# Altium footprint library Library_pcb.PcbLib: 59 footprints (part 2 of 4)
Each footprint in its own frame and in the unit in brackets; x right, y up, seen from the top. Pads: shape width x height; smd on the part's side, far side on the other; paste and mask are expansions set on the pad; w line width, h text height; cw(c..) or ccw(c..) is an arc to the next point about the centre after c.
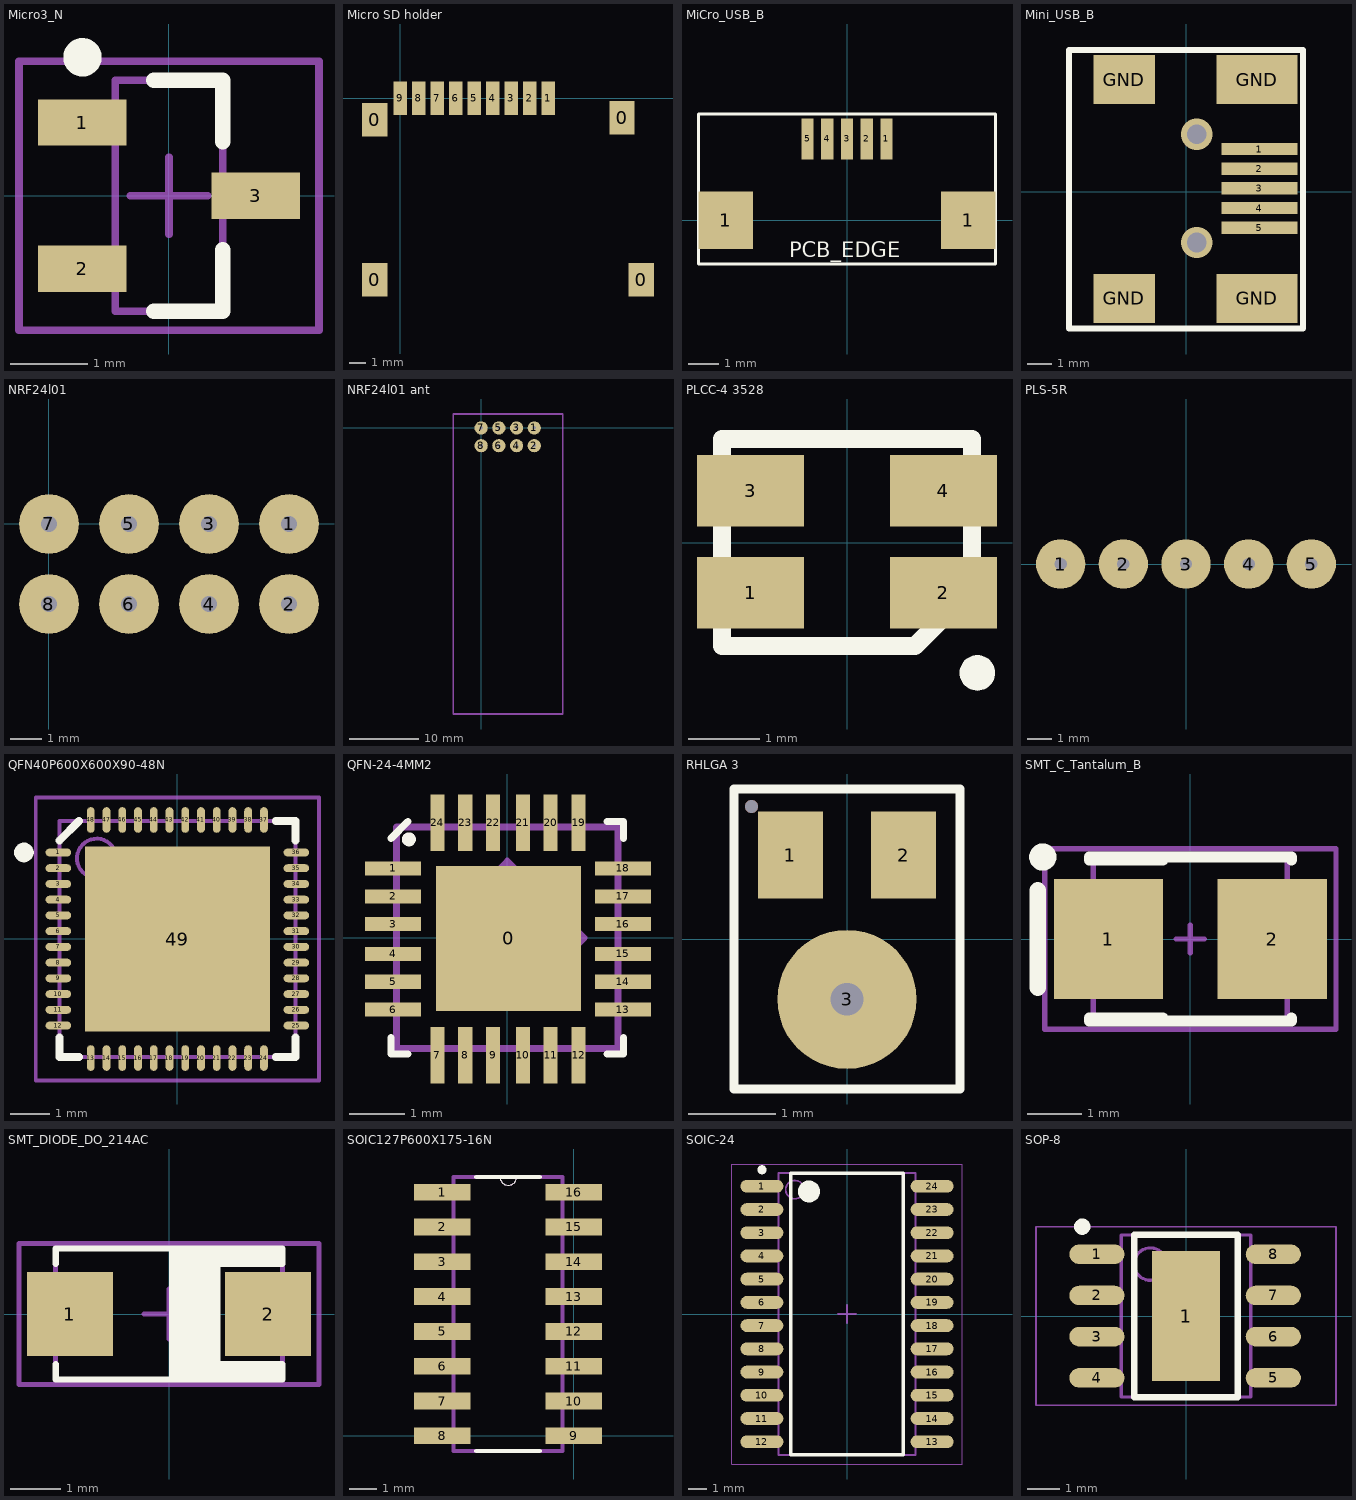
[diagram p1: the footprints below, top view; thin cyan lines are the x and y axes]

## Micro3_N [mm] "SOT23, 3-Leads, Body 2.9x1.3mm, Pitch 0.95mm, Lead Span 2.3mm, IPC Medium Density"
height 1.12
pads (3):
  rect 1.15x0.6 smd: 1(-1.125,0.95) 2(-1.125,-0.95) 3(1.125,0)
Top Overlay:
  circle w0.25: c-1.125,1.8 r0.125
  lines w0.2: -0.2,-1.5 0.7,-1.5 0.7,-0.7 ; -0.2,1.5 0.7,1.5 0.7,0.7
Mechanical 13:
  lines w0.1: -0.7,-1.5 0.7,-1.5 0.7,1.5 -0.7,1.5 -0.7,-1.5
Mechanical 15:
  lines w0.1: -0.5,0 0.5,0 ; 0,-0.5 0,0.5 ; -1.95,-1.75 1.95,-1.75 1.95,1.75 -1.95,1.75 -1.95,-1.75
3D body: height 1.12, standoff 0, extent -0.7,-1.5 0.7,1.5

## Micro SD holder [mm]
pads (13):
  rect 1.5x2 smd: 0(-1.524,-10.795) 0(-1.524,-1.27) 0(13.208,-1.143) 0(14.351,-10.795)
  rect 0.8x2 smd: 1(8.8,0) 2(7.7,0) 3(6.6,0) 4(5.5,0) 5(4.4,0) 6(3.3,0) 7(2.2,0) 8(1.1,0) 9(0,0)
3D body "User Library-Micro SD.step": height 1.91, standoff -0.56, extent -1.651,-15.032 14.656,0.178

## MiCro_USB_B [mm]
pads (7):
  rect 1.8x1.9 smd: 1(-4,0) 1(4,0)
  rect 0.4x1.35 smd: 1(1.3,2.675) 2(0.65,2.675) 3(0,2.675) 4(-0.65,2.675) 5(-1.3,2.675)
Top Overlay:
  lines w0.1: -4.9,-1.45 4.9,-1.45 4.9,3.5 -4.9,3.5 -4.9,-1.45
  text "PCB_EDGE" at -1.9,-1.225 h0.5

## Mini_USB_B [mm]
pads (9):
  rect 3.1x0.5 smd: 1(2.987,1.738) 2(2.987,0.938) 3(2.987,0.138) 4(2.987,-0.663) 5(2.987,-1.463)
  rect 2.5x2 smd: GND(-2.512,-4.337) GND(-2.512,4.563)
  rect 3.3x2 smd: GND(2.887,-4.337) GND(2.887,4.563)
via 0.437,2.338 diameter 1.27 hole 0.8
via 0.437,-2.062 diameter 1.27 hole 0.8
Top Overlay:
  lines w0.254: -4.763,-5.562 4.763,-5.562 4.763,5.762 -4.763,5.762 -4.763,5.563 -4.763,-5.562

## NRF24l01 [mm]
pads (8):
  round 1.9 hole 0.5: 1(7.62,0) 2(7.62,-2.54) 3(5.08,0) 4(5.08,-2.54) 5(2.54,0) 6(2.54,-2.54) 7(0,0) 8(0,-2.54)
3D body "nRF24L01+_enhanced.STEP": height 6.86, standoff -5.99, extent -5.341,-27.552 9.659,1.448

## NRF24l01 ant [mm]
pads (8):
  round 1.9 hole 0.5: 1(7.62,0) 2(7.62,-2.54) 3(5.08,0) 4(5.08,-2.54) 5(2.54,0) 6(2.54,-2.54) 7(0,0) 8(0,-2.54)
Mechanical 1:
  lines w0.1: -0.2,-2.74 -0.2,-2.34 0.2,-2.34 0.2,-2.74 -0.2,-2.74 ; -0.2,-0.2 0.2,-0.2 0.2,0.2 -0.2,0.2 -0.2,-0.2 ; 2.34,-2.74 2.34,-2.34 2.74,-2.34 2.74,-2.74 2.34,-2.74 ; 2.34,-0.2 2.34,0.2 2.74,0.2 2.74,-0.2 2.34,-0.2 ; 4.88,-2.74 4.88,-2.34 5.28,-2.34 5.28,-2.74 4.88,-2.74 ; 4.88,-0.2 4.88,0.2 5.28,0.2 5.28,-0.2 4.88,-0.2 ; 7.42,-2.74 7.42,-2.34 7.82,-2.34 7.82,-2.74 7.42,-2.74 ; 7.42,-0.2 7.42,0.2 7.82,0.2 7.82,-0.2 7.42,-0.2
  lines w0.254: -4,-41 11.7,-41 11.7,-25.3 11.7,0 11.7,2 -4,2 -4,-41
3D body: height 2, standoff 0, extent -4.127,-41.127 11.827,2.127
3D body: height 2.5, standoff -3, extent -0.199,-2.739 0.199,-2.341
3D body: height 2.5, standoff -3, extent 2.341,-2.739 2.739,-2.341
3D body: height 2.5, standoff -3, extent -0.199,-0.199 0.199,0.199
3D body: height 2.5, standoff -3, extent 2.341,-0.199 2.739,0.199
3D body: height 2.5, standoff -3, extent 4.881,-2.739 5.279,-2.341
3D body: height 2.5, standoff -3, extent 7.421,-2.739 7.819,-2.341
3D body: height 2.5, standoff -3, extent 4.881,-0.199 5.279,0.199
3D body: height 2.5, standoff -3, extent 7.421,-0.199 7.819,0.199

## PLCC-4 3528 [mm]
pads (5):
  rect 1.5x1 smd: 1(-1.35,-0.7) 2(1.35,-0.7) 3(-1.35,0.725) 4(1.35,0.725)
  round 0.5 on Top Overlay: ""(1.825,-1.825)
Top Overlay:
  lines w0.254: -1.75,-1.45 0.95,-1.45 1.75,-0.65 1.75,1.45 -1.75,1.45 -1.75,-1.45

## PLS-5R [mm]
pads (5):
  round 2 hole 0.5: 1(-5.08,0) 2(-2.54,0) 3(0,0) 4(2.54,0) 5(5.08,0)
3D body "User Library-PLS-5R.step": height 2.55, standoff -2.53, extent -6.35,-0.254 6.35,9.195

## QFN40P600X600X90-48N [mm]
pads (49):
  oval 0.65x0.2 smd: 1(-3.025,2.2) 2(-3.025,1.8) 3(-3.025,1.4) 4(-3.025,1) 5(-3.025,0.6) 6(-3.025,0.2) 7(-3.025,-0.2) 8(-3.025,-0.6) 9(-3.025,-1) 10(-3.025,-1.4) 11(-3.025,-1.8) 12(-3.025,-2.2) 25(3.025,-2.2) 26(3.025,-1.8) 27(3.025,-1.4) 28(3.025,-1) 29(3.025,-0.6) 30(3.025,-0.2) 31(3.025,0.2) 32(3.025,0.6) 33(3.025,1) 34(3.025,1.4) 35(3.025,1.8) 36(3.025,2.2)
  oval 0.2x0.65 smd: 13(-2.2,-3.025) 14(-1.8,-3.025) 15(-1.4,-3.025) 16(-1,-3.025) 17(-0.6,-3.025) 18(-0.2,-3.025) 19(0.2,-3.025) 20(0.6,-3.025) 21(1,-3.025) 22(1.4,-3.025) 23(1.8,-3.025) 24(2.2,-3.025) 37(2.2,3.025) 38(1.8,3.025) 39(1.4,3.025) 40(1,3.025) 41(0.6,3.025) 42(0.2,3.025) 43(-0.2,3.025) 44(-0.6,3.025) 45(-1,3.025) 46(-1.4,3.025) 47(-1.8,3.025) 48(-2.2,3.025)
  rect 4.7x4.7 smd: 49(0,0)
Top Overlay:
  circle w0.25: c-3.9,2.2 r0.125
  lines w0.2: -3,-2.5 -3,-3 -2.5,-3 ; -3,2.5 -2.5,3 ; 2.5,-3 3,-3 3,-2.5 ; 2.5,3 3,3 3,2.5
Mechanical 13:
  circle w0.1: c-2.05,2.05 r0.5
  lines w0.1: -3,-3 -3,3 3,3 3,-3 -3,-3
Mechanical 15:
  lines w0.1: -0.5,0 0.5,0 ; 0,-0.5 0,0.5 ; -3.6,-3.6 -3.6,3.6 3.6,3.6 3.6,-3.6 -3.6,-3.6
3D body: height 0.9, standoff 0, extent -3,-3 3,3

## QFN-24-4MM2 [mil]
pads (25):
  rect 103x103 smd mask-1000: 0(0.79,-0.39)
  rect 40x10 smd paste-1000 mask-1000: 1(-81.35,49.48) 2(-81.35,29.51) 3(-81.35,9.74) 4(-81.35,-11.32) 5(-81.35,-31.18) 6(-81.35,-51.05) 13(82.13,-51.05) 14(82.13,-31.18) 15(82.13,-11.32) 16(82.13,9.74) 17(82.13,29.51) 18(82.13,49.48)
  rect 10x40 smd paste-1000 mask-1000: 7(-49.87,-83.53) 8(-30,-83.53) 9(-10.14,-83.53) 10(10.93,-83.53) 11(30.69,-83.53) 12(50.66,-83.53) 19(50.66,81.95) 20(30.69,81.95) 21(10.93,81.95) 22(-10.14,81.95) 23(-30,81.95) 24(-49.87,81.95)
Top Overlay:
  circle w5: c-70.08,70.08 r2.49
  lines w5: -82.68,-70.87 -82.68,-82.68 -70.87,-82.68 ; -82.68,70.87 -70.87,82.68 ; 70.87,-82.68 82.68,-82.68 82.68,-70.87 ; 70.87,82.68 82.68,82.68 82.68,70.87
Top Paste:
  region: -44.87,61.95 -44.87,101.95 -54.87,101.95 -54.87,61.95
  region: -25,61.95 -25,101.95 -35,101.95 -35,61.95
  region: -5.14,61.95 -5.14,101.95 -15.14,101.95 -15.14,61.95
  region: 15.93,61.95 15.93,101.95 5.93,101.95 5.93,61.95
  region: 35.69,61.95 35.69,101.95 25.69,101.95 25.69,61.95
  region: 55.66,61.95 55.66,101.95 45.66,101.95 45.66,61.95
  region: -44.87,-103.53 -44.87,-63.53 -54.87,-63.53 -54.87,-103.53
  region: -25,-103.53 -25,-63.53 -35,-63.53 -35,-103.53
  region: -5.14,-103.53 -5.14,-63.53 -15.14,-63.53 -15.14,-103.53
  region: 15.93,-103.53 15.93,-63.53 5.93,-63.53 5.93,-103.53
  region: 35.69,-103.53 35.69,-63.53 25.69,-63.53 25.69,-103.53
  region: 55.66,-103.53 55.66,-63.53 45.66,-63.53 45.66,-103.53
  region: 102.13,-46.05 62.13,-46.05 62.13,-56.05 102.13,-56.05
  region: 102.13,-26.18 62.13,-26.18 62.13,-36.19 102.13,-36.19
  region: 102.13,-6.32 62.13,-6.32 62.13,-16.32 102.13,-16.32
  region: 102.13,14.74 62.13,14.74 62.13,4.74 102.13,4.74
  region: 102.13,34.51 62.13,34.51 62.13,24.51 102.13,24.51
  region: 102.13,54.48 62.13,54.48 62.13,44.48 102.13,44.48
  region: -61.35,-46.05 -101.35,-46.05 -101.35,-56.05 -61.35,-56.05
  region: -61.35,-26.18 -101.35,-26.18 -101.35,-36.19 -61.35,-36.19
  region: -61.35,-6.32 -101.35,-6.32 -101.35,-16.32 -61.35,-16.32
  region: -61.35,14.74 -101.35,14.74 -101.35,4.74 -61.35,4.74
  region: -61.35,34.51 -101.35,34.51 -101.35,24.51 -61.35,24.51
  region: -61.35,54.48 -101.35,54.48 -101.35,44.48 -61.35,44.48
Top Solder:
  region: -40.93,58.02 -40.93,105.89 -58.81,105.89 -58.81,58.02
  region: -21.07,58.02 -21.07,105.89 -38.94,105.89 -38.94,58.02
  region: -1.2,58.02 -1.2,105.89 -19.07,105.89 -19.07,58.02
  region: 19.86,58.02 19.86,105.89 1.99,105.89 1.99,58.02
  region: 39.63,58.02 39.63,105.89 21.76,105.89 21.76,58.02
  region: 59.59,58.02 59.59,105.89 41.72,105.89 41.72,58.02
  region: -40.93,-107.46 -40.93,-59.59 -58.81,-59.59 -58.81,-107.46
  region: -21.07,-107.46 -21.07,-59.59 -38.94,-59.59 -38.94,-107.46
  region: -1.2,-107.46 -1.2,-59.59 -19.07,-59.59 -19.07,-107.46
  region: 19.86,-107.46 19.86,-59.59 1.99,-59.59 1.99,-107.46
  region: 39.63,-107.46 39.63,-59.59 21.76,-59.59 21.76,-107.46
  region: 59.59,-107.46 59.59,-59.59 41.72,-59.59 41.72,-107.46
  region: 106.07,-42.11 58.2,-42.11 58.2,-59.99 106.07,-59.99
  region: 106.07,-22.25 58.2,-22.25 58.2,-40.12 106.07,-40.12
  region: 106.07,-2.38 58.2,-2.38 58.2,-20.26 106.07,-20.26
  region: 106.07,18.68 58.2,18.68 58.2,0.81 106.07,0.81
  region: 106.07,38.45 58.2,38.45 58.2,20.57 106.07,20.57
  region: 106.07,58.41 58.2,58.41 58.2,40.54 106.07,40.54
  region: -57.41,-42.11 -105.28,-42.11 -105.28,-59.99 -57.41,-59.99
  region: -57.41,-22.25 -105.28,-22.25 -105.28,-40.12 -57.41,-40.12
  region: -57.41,-2.38 -105.28,-2.38 -105.28,-20.26 -57.41,-20.26
  region: -57.41,18.68 -105.28,18.68 -105.28,0.81 -57.41,0.81
  region: -57.41,38.45 -105.28,38.45 -105.28,20.57 -57.41,20.57
  region: -57.41,58.41 -105.28,58.41 -105.28,40.54 -57.41,40.54
  region: -54.65,-55.83 56.22,-55.83 56.22,55.04 -54.65,55.04
Mechanical 1:
  circle w3.94: c0,0 r7.87
  lines w3.94: -11.83,27.46 cw(c0,25.59) 11.83,27.46 ; -7.87,47.24 0,55.12 ; 0,7.87 0,55.12 ; 7.87,0 55.12,0 ; 7.87,27.56 11.81,27.56 15.75,31.5 ; 7.87,47.24 0,55.12 ; 27.46,-11.83 ccw(c25.59,0) 27.46,11.83 ; 27.56,-7.87 27.56,-11.81 31.5,-15.75 ; 47.24,-7.87 55.12,0 ; 47.24,7.87 55.12,0
  lines w5: -78.74,-78.74 78.74,-78.74 78.74,78.74 -78.74,78.74 -78.74,-78.74

## RHLGA 3 [mm]
pads (3):
  rect 0.75x1 smd: 1(-0.65,0.965) 2(0.65,0.965)
  round 1.6 hole 0.375: 3(0,-0.695)
via -1.1,1.525 diameter 0.15 hole 0.15
Top Overlay:
  lines w0.1: -1.3,-1.725 1.3,-1.725 1.3,0 1.3,1.725 -1.3,1.725 -1.3,0 -1.3,-1.725

## SMT_C_Tantalum_B [mm] "Capacitor, SM Tantalum; Body 3.5 x 2.8 mm (LxW typ)"
height 2.1
pads (2):
  rect 2x2.2 smd: 1(-1.5,0) 2(1.5,0)
Top Overlay:
  circle w0.25: c-2.7,1.5 r0.125
  lines w0.2: -1.85,-1.5 1.85,-1.5 1.85,-1.45 ; -1.85,-1.45 -0.5,-1.45 ; -1.85,1.45 -0.5,1.45 ; -1.85,1.5 1.85,1.5 1.85,1.45
  lines w0.305: -2.794,-0.889 -2.794,0.889
Mechanical 13:
  lines w0.1: -1.778,-1.524 1.778,-1.524 1.778,1.524 -1.778,1.524 -1.778,-1.524
Mechanical 15:
  lines w0.1: -0.254,0 0.254,0 ; 0,-0.254 0,0.254 ; -2.667,-1.651 -2.667,1.651 2.667,1.651 2.667,-1.651 -2.667,-1.651
3D body "User Library-Cap-Tantalum-Case-B-3528-21.step": height 1.9, standoff 0, extent -1.75,-1.403 1.75,1.397

## SMT_DIODE_DO_214AC [mm] "DO-214AC(SMA) Package"
height 2.438
pads (2):
  rect 1.7x1.67 smd: 1(-1.965,0) 2(1.965,0)
Top Overlay:
  region: 0,1.3 0,-1.3 1.025,-1.3 1.025,1.3
  region: 2.25,1.3 0,1.3 0,0.936 2.25,0.936
  rectangle: 0,-1.3 2.25,-0.936
  lines w0.127: -2.25,-1 -2.25,-1.3 2.25,-1.3 2.25,-1 ; -2.25,1 -2.25,1.3 2.25,1.3 2.25,1
Mechanical 13:
  lines w0.1: -2.25,-1.3 2.25,-1.3 2.25,1.3 -2.25,1.3 -2.25,-1.3
Mechanical 15:
  lines w0.1: -0.5,0 0.5,0 ; 0,-0.5 0,0.5 ; -2.975,-1.4 2.975,-1.4 2.975,1.4 -2.975,1.4 -2.975,-1.4
3D body "User Library-DO-214AC SMA.step": height 2.35, standoff -0.05, extent -2.6,-1.3 2.6,1.3

## SOIC127P600X175-16N [mil]
pads (16):
  rect 81x24 smd paste-1000 mask-1000: 1(-189,350) 2(-189,300) 3(-189,250) 4(-189,200) 5(-189,150) 6(-189,100) 7(-189,50) 8(-189,0) 9(0,0) 10(0,50) 11(0,100) 12(0,150) 13(0,200) 14(0,250) 15(0,300) 16(0,350)
Top Overlay:
  lines w0: -106,372 ccw(c-94,372) -82,372
  lines w6: -140,-22 -49,-22 ; -140,372 -106,372 -82,372 -49,372
Top Paste:
  region: -229.5,338 -148.5,338 -148.5,362 -229.5,362
  region: -229.5,288 -148.5,288 -148.5,312 -229.5,312
  region: -229.5,238 -148.5,238 -148.5,262 -229.5,262
  region: -229.5,188 -148.5,188 -148.5,212 -229.5,212
  region: -229.5,138 -148.5,138 -148.5,162 -229.5,162
  region: -229.5,88 -148.5,88 -148.5,112 -229.5,112
  region: -229.5,38 -148.5,38 -148.5,62 -229.5,62
  region: -229.5,-12 -148.5,-12 -148.5,12 -229.5,12
  region: -40.5,-12 40.5,-12 40.5,12 -40.5,12
  region: -40.5,38 40.5,38 40.5,62 -40.5,62
  region: -40.5,88 40.5,88 40.5,112 -40.5,112
  region: -40.5,138 40.5,138 40.5,162 -40.5,162
  region: -40.5,188 40.5,188 40.5,212 -40.5,212
  region: -40.5,238 40.5,238 40.5,262 -40.5,262
  region: -40.5,288 40.5,288 40.5,312 -40.5,312
  region: -40.5,338 40.5,338 40.5,362 -40.5,362
Top Solder:
  region: -233.44,334.06 -144.56,334.06 -144.56,365.94 -233.44,365.94
  region: -233.44,284.06 -144.56,284.06 -144.56,315.94 -233.44,315.94
  region: -233.44,234.06 -144.56,234.06 -144.56,265.94 -233.44,265.94
  region: -233.44,184.06 -144.56,184.06 -144.56,215.94 -233.44,215.94
  region: -233.44,134.06 -144.56,134.06 -144.56,165.94 -233.44,165.94
  region: -233.44,84.06 -144.56,84.06 -144.56,115.94 -233.44,115.94
  region: -233.44,34.06 -144.56,34.06 -144.56,65.94 -233.44,65.94
  region: -233.44,-15.94 -144.56,-15.94 -144.56,15.94 -233.44,15.94
  region: -44.44,-15.94 44.44,-15.94 44.44,15.94 -44.44,15.94
  region: -44.44,34.06 44.44,34.06 44.44,65.94 -44.44,65.94
  region: -44.44,84.06 44.44,84.06 44.44,115.94 -44.44,115.94
  region: -44.44,134.06 44.44,134.06 44.44,165.94 -44.44,165.94
  region: -44.44,184.06 44.44,184.06 44.44,215.94 -44.44,215.94
  region: -44.44,234.06 44.44,234.06 44.44,265.94 -44.44,265.94
  region: -44.44,284.06 44.44,284.06 44.44,315.94 -44.44,315.94
  region: -44.44,334.06 44.44,334.06 44.44,365.94 -44.44,365.94
Mechanical 1:
  lines w0: -106,372 ccw(c-94,372) -82,372
  lines w6: -189,0 -173,0 ; -189,50 -173,50 ; -189,100 -173,100 ; -189,150 -173,150 ; -189,200 -173,200 ; -189,250 -173,250 ; -189,300 -173,300 ; -189,350 -173,350 ; -16,0 0,0 ; -16,50 0,50 ; -16,100 0,100 ; -16,150 0,150 ; -16,200 0,200 ; -16,250 0,250 ; -16,300 0,300 ; -16,350 0,350 ; -173,-22 -16,-22 -16,372 -82,372 -106,372 -173,372 -173,-22

## SOIC-24 [mm] "SOIC, 24-Leads, Body 15.4x7.5mm, Pitch 1.27mm, IPC Low Density"
height 2.65
pads (24):
  oval 2.35x0.7 smd: 1(-4.65,6.985) 2(-4.65,5.715) 3(-4.65,4.445) 4(-4.65,3.175) 5(-4.65,1.905) 6(-4.65,0.635) 7(-4.65,-0.635) 8(-4.65,-1.905) 9(-4.65,-3.175) 10(-4.65,-4.445) 11(-4.65,-5.715) 12(-4.65,-6.985) 13(4.65,-6.985) 14(4.65,-5.715) 15(4.65,-4.445) 16(4.65,-3.175) 17(4.65,-1.905) 18(4.65,-0.635) 19(4.65,0.635) 20(4.65,1.905) 21(4.65,3.175) 22(4.65,4.445) 23(4.65,5.715) 24(4.65,6.985)
Top Overlay:
  circle w0.25: c-4.65,7.885 r0.125
  circle w0.6: c-2.075,6.7 r0.3
  lines w0.2: -3.075,-7.7 -3.075,7.7 3.075,7.7 3.075,-7.7 -3.075,-7.7
Mechanical 13:
  circle w0.1: c-2.85,6.8 r0.5
  lines w0.1: -3.75,-7.7 -3.75,7.7 3.75,7.7 3.75,-7.7 -3.75,-7.7
Mechanical 15:
  lines w0.05: -6.3,-8.2 -6.3,8.2 6.3,8.2 6.3,-8.2 -6.3,-8.2
  lines w0.1: -0.5,0 0.5,0 ; 0,-0.5 0,0.5
3D body "SOIC_24.STEP": height 2.6, standoff 0, extent -5.2,-7.78 5.2,7.62

## SOP-8 [mm] "TSOP, 8-Leads, Body 4,90x3,95mm, Pitch 1,27mm, Thermal Pad 4,00x2,10mm, IPC Medium Density"
height 1.5
pads (9):
  oval 1.7x0.6 smd: 1(-2.746,1.905) 2(-2.746,0.635) 3(-2.746,-0.635) 4(-2.746,-1.905) 5(2.692,-1.905) 6(2.692,-0.635) 7(2.692,0.635) 8(2.692,1.905)
  rect 2.1x4 smd: 1(0,0)
Top Overlay:
  circle w0.25: c-3.2,2.755 r0.125
  lines w0.2: -1.6,-2.5 1.6,-2.5 1.6,2.5 -1.6,2.5 -1.6,-2.5
Mechanical 13:
  circle w0.1: c-1.1,1.6 r0.5
  lines w0.1: -2,-2.5 2,-2.5 2,2.5 -2,2.5 -2,-2.5
Mechanical 15:
  lines w0.05: -4.625,-2.75 4.625,-2.75 4.625,2.75 -4.625,2.75 -4.625,-2.75
3D body "User Library-sop-8.step": height 1.6, standoff 0, extent -3.021,-2.51 3.021,2.51